# Altium footprint library Angler.PcbLib: 331 footprints (part 21 of 21)
Each footprint in its own frame and in the unit in brackets; x right, y up, seen from the top. Pads: shape width x height; smd on the part's side, far side on the other; paste and mask are expansions set on the pad; w line width, h text height; cw(c..) or ccw(c..) is an arc to the next point about the centre after c.
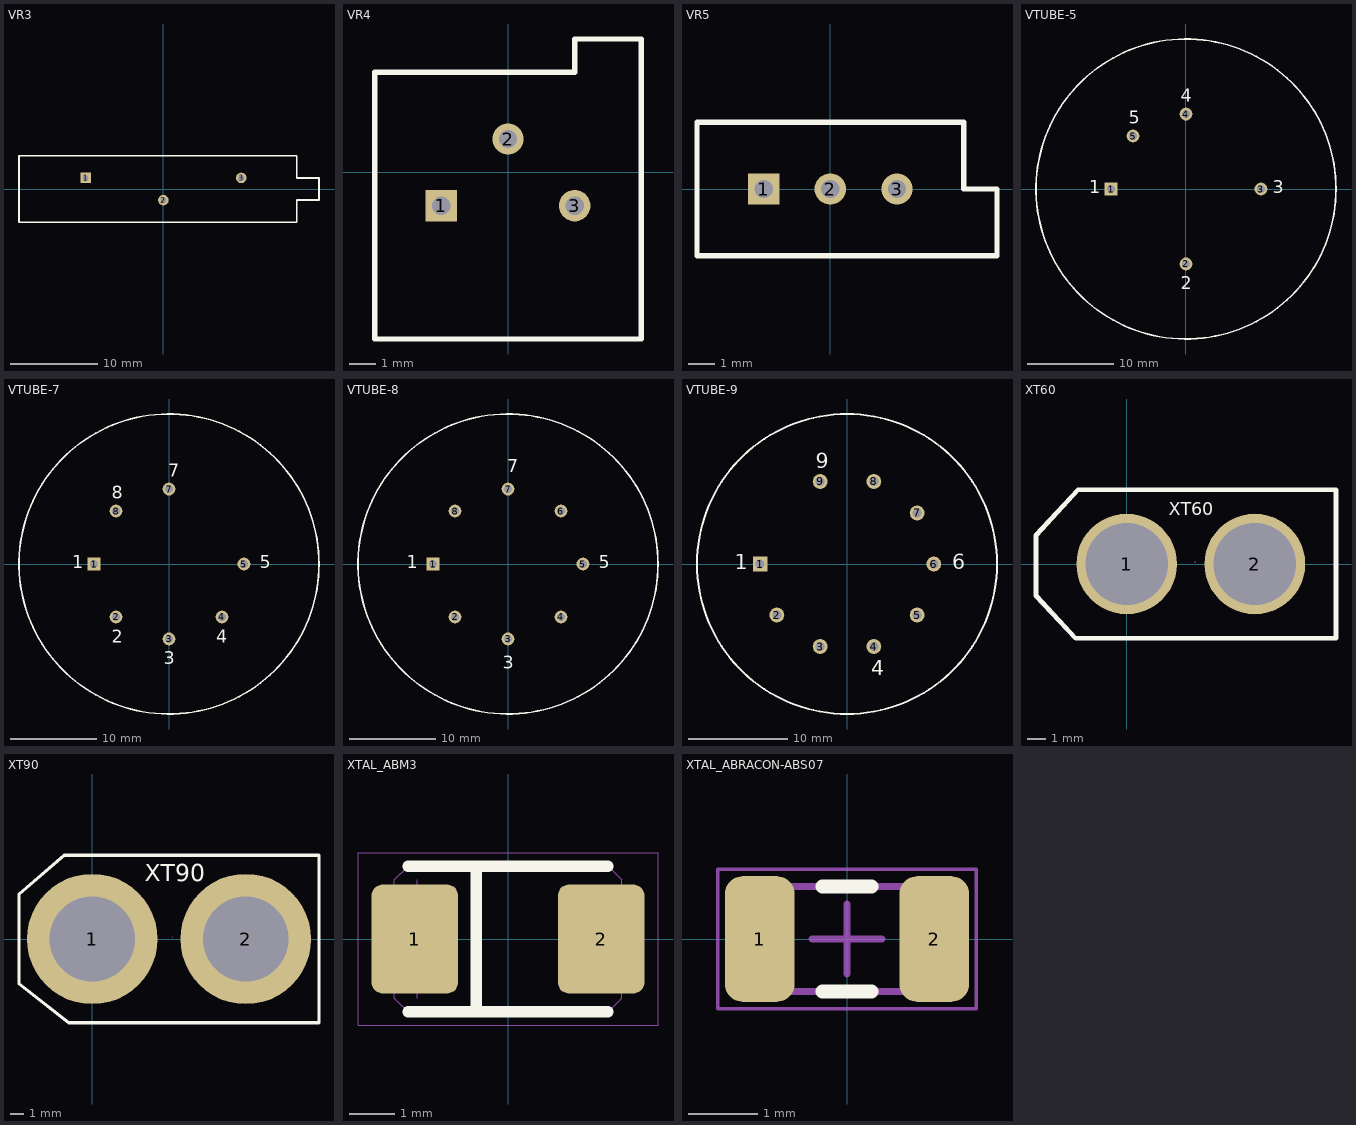
[diagram p20: the footprints below, top view; thin cyan lines are the x and y axes]

## VR3 [mm] "Thru-Hole; 3 Leads"
pads (3):
  rect 1.2x1.2 hole 0.7: 1(-8.89,1.27)
  round 1.2 hole 0.7: 2(0,-1.27) 3(8.89,1.27)
Top Overlay:
  lines w0.2: -16.51,-3.81 -16.51,3.81 15.24,3.81 15.24,1.27 17.78,1.27 17.78,-1.27 15.24,-1.27 15.24,-3.81 -16.51,-3.81

## VR4 [mm] "Thru-Hole; 3 Leads"
pads (3):
  rect 1.2x1.2 hole 0.7: 1(-2.54,-1.27)
  round 1.2 hole 0.7: 2(0,1.27) 3(2.54,-1.27)
Top Overlay:
  lines w0.2: -5.08,-6.35 5.08,-6.35 5.08,5.08 2.54,5.08 2.54,3.81 -5.08,3.81 -5.08,-6.35

## VR5 [mm] "Thru-Hole; 3 Leads"
pads (3):
  rect 1.2x1.2 hole 0.7: 1(-2.54,0)
  round 1.2 hole 0.7: 2(0,0) 3(2.54,0)
Top Overlay:
  lines w0.2: -5.08,-2.54 6.35,-2.54 6.35,0 5.08,0 5.08,2.54 -5.08,2.54 -5.08,-2.54

## VTUBE-5 [mm] "Vacuum Tube; 5 Leads"
pads (5):
  rect 1.5x1.5 hole 0.9: 1(-8.725,0)
  round 1.5 hole 0.9: 2(0,-8.725) 3(8.725,0) 4(0,8.725) 5(-6.17,6.17)
Top Overlay:
  circle w0.2: c0,0 r17.462
  text "1" at -11.265,-0.508 h1.5
  text "2" at -0.597,-11.684 h1.5
  text "4" at -0.597,10.16 h1.5
  text "5" at -6.693,7.62 h1.5
  text "3" at 10.071,-0.508 h1.5

## VTUBE-7 [mm] "Vacuum Tube; 7 Leads"
height 108
pads (7):
  rect 1.5x1.5 hole 0.9: 1(-8.725,0)
  round 1.5 hole 0.9: 2(-6.17,-6.17) 3(0,-8.725) 4(6.17,-6.17) 5(8.725,0) 7(0,8.725) 8(-6.17,6.17)
Top Overlay:
  circle w0.2: c0,0 r17.462
  text "8" at -6.693,7.62 h1.5
  text "7" at -0.089,10.16 h1.5
  text "5" at 10.579,-0.508 h1.5
  text "4" at 5.499,-9.144 h1.5
  text "3" at -0.597,-11.684 h1.5
  text "2" at -6.693,-9.144 h1.5
  text "1" at -11.265,-0.508 h1.5

## VTUBE-8 [mm] "Vacuum Tube; 8 Leads"
height 108
pads (8):
  rect 1.5x1.5 hole 0.9: 1(-8.725,0)
  round 1.5 hole 0.9: 2(-6.17,-6.17) 3(0,-8.725) 4(6.17,-6.17) 5(8.725,0) 6(6.17,6.17) 7(0,8.725) 8(-6.17,6.17)
Top Overlay:
  circle w0.2: c0,0 r17.462
  text "1" at -11.773,-0.508 h1.5
  text "3" at -0.597,-12.192 h1.5
  text "5" at 10.579,-0.508 h1.5
  text "7" at -0.089,10.668 h1.5

## VTUBE-9 [mm] "Vacuum Tube; 9 Leads"
height 66.7
pads (9):
  rect 1.5x1.5 hole 0.9: 1(-8.725,0)
  round 1.5 hole 0.9: 2(-7.059,-5.128) 3(-2.696,-8.298) 4(2.696,-8.298) 5(7.059,-5.128) 6(8.725,0) 7(7.059,5.128) 8(2.696,8.298) 9(-2.696,8.298)
Top Overlay:
  circle w0.2: c0,0 r15.081
  text "4" at 2.451,-11.176 h1.5
  text "6" at 10.579,-0.508 h1.5
  text "9" at -3.137,9.652 h1.5
  text "1" at -11.265,-0.508 h1.5

## XT60 [mil] "XT60 Connector"
pads (2):
  round 216.5 hole 177.16: 1(0,0) 2(275.6,0)
Top Overlay:
  lines w10: -195,-67.96 -109.91,-160 450,-160 450,160 -104.54,160 -195,62.14 -195,-67.96
  text "XT60" at 90,105 h27.6
Mechanical 15:
  lines w0.1: 146.79,4 148.79,6
3D body "XT-60_Femea.STEP": height 677.17, standoff -161.42, extent -190.87,-160 450.87,162.84

## XT90 [mm] "XT90 Connector"
pads (2):
  round 9.5 hole 6.2: 1(0,0) 2(11.176,0)
Top Overlay:
  lines w0.254: -5.334,-3.263 -1.707,-6.096 16.51,-6.096 16.51,6.096 -2.032,6.096 -5.334,3.263 -5.334,-3.263
  text "XT90" at 3.81,4.201 h1.25
Mechanical 15:
  lines w0.003: 5.817,0.102 5.867,0.152
3D body "xt90_male_asm.stp": height 20.7, standoff -5.5, extent -5.1,-5.8 16.3,5.2

## XTAL_ABM3 [mm] "CRYSTAL 25.0000MHZ 18PF SMD 5x3.2mm"
height 1.3
pads (2):
  rrect25% 1.9x2.4 smd mask+0.1: 1(-2.05,0) 2(2.05,0)
Top Overlay:
  lines w0.25: -2.2,-1.6 2.2,-1.6 ; -2.2,1.6 2.2,1.6 ; -0.7,-1.6 -0.7,1.6
Mechanical 9:
  lines w0.01: -2,-1.3 -2,1.3 ; -2.5,-1.3 -2.2,-1.6 2.2,-1.6 2.5,-1.3 2.5,1.3 2.2,1.6 -2.2,1.6 -2.5,1.3 -2.5,-1.3
Mechanical 15:
  lines w0.01: -3.3,-1.9 -3.3,1.8 -3.3,1.9 3.3,1.9 3.3,-1.8 3.3,-1.9 -3.3,-1.9
3D body: height 0.4, standoff 0, extent -2.5,-1.6 2.5,1.6
3D body: height 1.3, standoff 0, extent -2.203,-1.299 2.2,1.3
3D body: height 1.3, standoff 0, extent 1.204,-1.299 2.2,-0.301
3D body: height 1.3, standoff 0, extent 1.204,0.301 2.2,1.299
3D body: height 1.3, standoff 0, extent -2.196,-1.299 -1.2,-0.301
3D body: height 1.3, standoff 0, extent -2.196,0.301 -1.2,1.299

## XTAL_ABRACON-ABS07 [mm] "Abracon ABS07 Series 3.2x1.5x0.9mm"
height 0.9
pads (2):
  rrect50% 1x1.8 smd: 1(-1.25,0) 2(1.25,0)
Top Overlay:
  lines w0.2: -0.35,-0.75 0.35,-0.75 ; -0.35,0.75 0.35,0.75
Mechanical 11:
  text "'.Designator'" at -0.6,-0.3 h0.5
Mechanical 13:
  lines w0.1: -1.6,-0.75 1.6,-0.75 1.6,0.75 -1.6,0.75 -1.6,-0.75
Mechanical 15:
  lines w0.05: -1.85,-1 1.85,-1 1.85,1 -1.85,1 -1.85,-1
  lines w0.1: -0.5,0 0.5,0 ; 0,-0.5 0,0.5
3D body "ABS07.STEP": height 0.9, standoff 0.01, extent -1.6,-0.749 1.6,0.749